# Altium footprint library 6-Connectors-3.PcbLib: 153 footprints (part 4 of 11)
Each footprint in its own frame and in the unit in brackets; x right, y up, seen from the top. Pads: shape width x height; smd on the part's side, far side on the other; paste and mask are expansions set on the pad; w line width, h text height; cw(c..) or ccw(c..) is an arc to the next point about the centre after c.
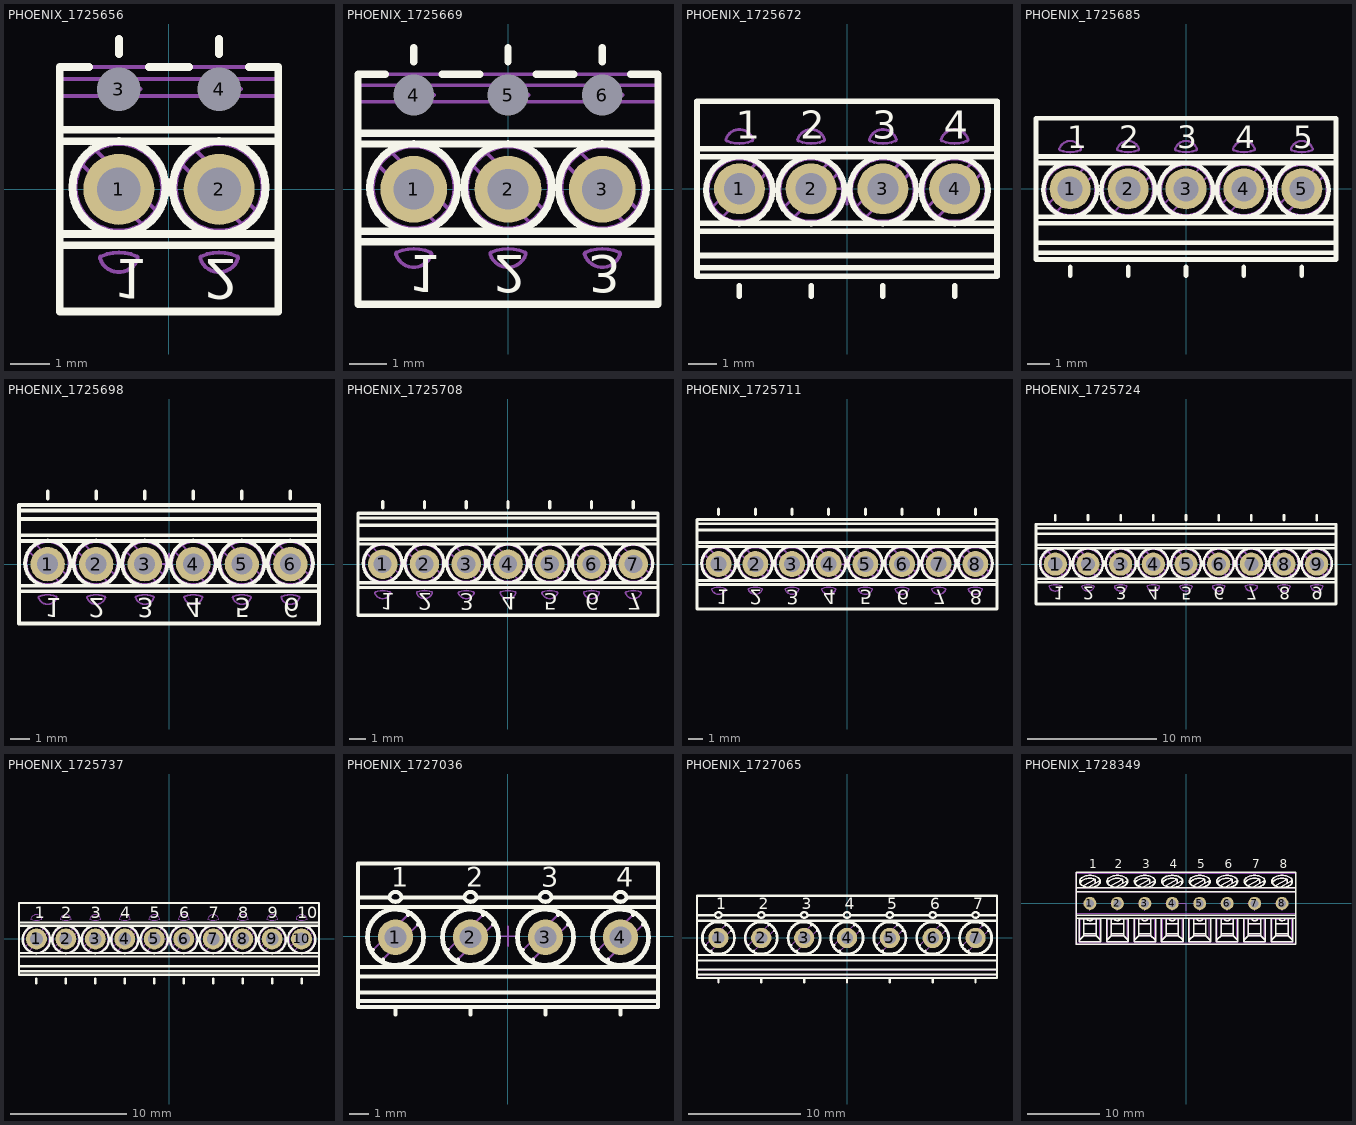
[diagram p3: the footprints below, top view; thin cyan lines are the x and y axes]

## PHOENIX_1725656 [mm] "Micro PCB Terminal Block, Pitch 2.54mm, 2 Positions, Screw Connection"
height 8.5
pads (4):
  round 1.8 hole 1.1: 1(-1.27,0) 2(1.27,0)
  round 1 hole 1.1 unplated: 3(-1.27,2.54) 4(1.27,2.54)
Top Overlay:
  circle w0.2: c-1.27,0.05 r1.18
  circle w0.2: c1.27,0.05 r1.18
  lines w0.2: -2.77,-1.417 2.77,-1.417 ; -2.77,-1.132 2.77,-1.132 ; -2.77,1.22 2.77,1.22 ; -2.77,1.51 2.77,1.51 ; -2.032,3.1 -2.77,3.1 -2.77,-3.1 2.77,-3.1 2.77,3.1 2.032,3.1 ; -1.27,3.429 -1.27,3.81 ; -0.508,3.1 0.508,3.1 ; 1.27,3.429 1.27,3.81
  text "2" at 0.889,-1.778 h1
  text "1" at -1.397,-1.778 h1
Mechanical 8:
  lines w0.1: -1.82,0 -1.27,0 -1.27,0.55 ; -1.27,3.09 -1.27,2.54 -0.72,2.54 ; 1.27,0.55 1.27,0 1.82,0 ; 1.27,3.09 1.27,2.54 1.82,2.54
Mechanical 14:
  circle w0.1: c-1.27,0.05 r1.1
  circle w0.1: c1.27,0.05 r1.1
  lines w0.1: -2.77,-1.417 2.77,-1.417 ; -2.77,-1.132 2.77,-1.132 ; -2.77,1.22 2.77,1.22 ; -2.77,1.51 2.77,1.51 ; -2.77,2.361 2.77,2.361 ; -2.77,2.8 2.77,2.8 ; -2.168,0.594 -0.726,-0.848 ; -1.814,0.948 -0.372,-0.494 ; 0.372,0.594 1.814,-0.848 ; 0.726,0.948 2.168,-0.494 ; -2.77,-3.1 -2.77,3.1 2.77,3.1 2.77,-3.1 -2.77,-3.1 ; -1.745,-1.757 ccw(c-1.27,-1.6) -0.795,-1.757 ccw(c-0.843,-1.741) -0.822,-1.696 ccw(c-1.27,-2.696) -1.718,-1.696 ccw(c-1.697,-1.741) -1.745,-1.757 ; 0.795,-1.757 cw(c0.843,-1.741) 0.822,-1.696 cw(c1.27,-2.696) 1.718,-1.696 cw(c1.697,-1.741) 1.745,-1.757 cw(c1.27,-1.6) 0.795,-1.757
3D body "PHOENIX_1725656.stp": height 8.5, standoff -3.5, extent -2.77,-3.1 2.77,3.1

## PHOENIX_1725669 [mm] "Micro PCB Terminal Block, Pitch 2.54mm, 3 Positions, Screw Connection"
height 8.5
pads (6):
  round 1.8 hole 1.1: 1(-2.54,0) 2(0,0) 3(2.54,0)
  round 1 hole 1.1 unplated: 4(-2.54,2.54) 5(0,2.54) 6(2.54,2.54)
Top Overlay:
  circle w0.2: c-2.54,0.05 r1.18
  circle w0.2: c0,0.05 r1.18
  circle w0.2: c2.54,0.05 r1.18
  lines w0.2: -4.04,-1.417 4.04,-1.417 ; -4.04,-1.132 4.04,-1.132 ; -4.04,1.22 4.04,1.22 ; -4.04,1.51 4.04,1.51 ; -3.302,3.1 -4.04,3.1 -4.04,-3.1 4.04,-3.1 4.04,3.1 3.302,3.1 ; -2.54,3.429 -2.54,3.81 ; -1.778,3.1 -0.762,3.1 ; 0,3.429 0,3.81 ; 0.762,3.1 1.778,3.1 ; 2.54,3.429 2.54,3.81
  text "1" at -2.667,-1.778 h1
  text "2" at -0.381,-1.778 h1
  text "3" at 2.159,-1.778 h1
Mechanical 8:
  lines w0.1: -3.09,0 -2.54,0 -2.54,0.55 ; -2.54,3.09 -2.54,2.54 -1.99,2.54 ; -0.55,0 0,0 0,0.55 ; 0,3.09 0,2.54 0.55,2.54 ; 1.99,0 2.54,0 2.54,0.55 ; 2.54,3.09 2.54,2.54 3.09,2.54
Mechanical 14:
  circle w0.1: c-2.54,0.05 r1.1
  circle w0.1: c0,0.05 r1.1
  circle w0.1: c2.54,0.05 r1.1
  lines w0.1: -4.04,-1.417 4.04,-1.417 ; -4.04,-1.132 4.04,-1.132 ; -4.04,1.22 4.04,1.22 ; -4.04,1.51 4.04,1.51 ; -4.04,2.361 4.04,2.361 ; -4.04,2.8 4.04,2.8 ; -3.474,0.631 -1.959,-0.884 ; -3.121,0.984 -1.606,-0.531 ; -0.934,0.631 0.581,-0.884 ; -0.581,0.984 0.934,-0.531 ; 1.606,0.631 3.121,-0.884 ; 1.959,0.984 3.474,-0.531 ; -4.04,-3.1 4.04,-3.1 4.04,3.1 -4.04,3.1 -4.04,-3.1 ; -3.015,-1.757 cw(c-2.967,-1.741) -2.988,-1.696 cw(c-2.54,-2.696) -2.092,-1.696 cw(c-2.113,-1.741) -2.065,-1.757 cw(c-2.54,-1.6) -3.015,-1.757 ; -0.475,-1.757 cw(c-0.427,-1.741) -0.448,-1.696 cw(c0,-2.696) 0.448,-1.696 cw(c0.427,-1.741) 0.475,-1.757 cw(c0,-1.6) -0.475,-1.757 ; 2.065,-1.757 cw(c2.113,-1.741) 2.092,-1.696 cw(c2.54,-2.696) 2.988,-1.696 cw(c2.967,-1.741) 3.015,-1.757 cw(c2.54,-1.6) 2.065,-1.757
3D body "PHOENIX_1725669.stp": height 8.5, standoff -3.5, extent -4.04,-3.1 4.04,3.1

## PHOENIX_1725672 [mm] "Micro PCB Terminal Block, Pitch 2.54mm, 4 Positions, Screw Connection"
height 8.5
pads (4):
  round 1.8 hole 1.1: 1(-3.81,0) 2(-1.27,0) 3(1.27,0) 4(3.81,0)
Top Overlay:
  circle w0.2: c-3.81,-0.05 r1.18
  circle w0.2: c-1.27,-0.05 r1.18
  circle w0.2: c1.27,-0.05 r1.18
  circle w0.2: c3.81,-0.05 r1.18
  lines w0.2: -5.31,-2.8 5.31,-2.8 ; -5.31,-2.361 5.31,-2.361 ; -5.31,-1.51 5.31,-1.51 ; -5.31,-1.22 5.31,-1.22 ; -5.31,1.132 5.31,1.132 ; -5.31,1.417 5.31,1.417 ; -3.81,-3.81 -3.81,-3.429 ; -1.27,-3.81 -1.27,-3.429 ; 1.27,-3.81 1.27,-3.429 ; 3.81,-3.81 3.81,-3.429 ; -5.31,-3.1 5.31,-3.1 5.31,3.1 -5.31,3.1 -5.31,-3.1
  text "4" at 3.429,1.778 h1
  text "1" at -3.937,1.778 h1
  text "2" at -1.651,1.778 h1
  text "3" at 0.889,1.778 h1
Mechanical 8:
  lines w0.1: -4.36,0 -3.81,0 -3.81,-0.55 ; -1.82,0 -1.27,0 -1.27,-0.55 ; -0.55,0 0,0 0,-0.55 ; 0.72,0 1.27,0 1.27,-0.55 ; 3.26,0 3.81,0 3.81,-0.55
Mechanical 14:
  circle w0.1: c-3.81,-0.05 r1.1
  circle w0.1: c-1.27,-0.05 r1.1
  circle w0.1: c1.27,-0.05 r1.1
  circle w0.1: c3.81,-0.05 r1.1
  lines w0.1: -5.31,-2.8 5.31,-2.8 ; -5.31,-2.361 5.31,-2.361 ; -5.31,-1.51 5.31,-1.51 ; -5.31,-1.22 5.31,-1.22 ; -5.31,1.132 5.31,1.132 ; -5.31,1.417 5.31,1.417 ; -4.744,-0.631 -3.229,0.884 ; -4.391,-0.984 -2.876,0.531 ; -2.204,-0.631 -0.689,0.884 ; -1.851,-0.984 -0.336,0.531 ; 0.336,-0.631 1.851,0.884 ; 0.689,-0.984 2.204,0.531 ; 2.876,-0.631 4.391,0.884 ; 3.229,-0.984 4.744,0.531 ; -5.31,-3.1 5.31,-3.1 5.31,3.1 -5.31,3.1 -5.31,-3.1 ; -4.285,1.757 ccw(c-4.237,1.741) -4.258,1.696 ccw(c-3.81,2.697) -3.362,1.696 ccw(c-3.383,1.741) -3.335,1.757 ccw(c-3.81,1.6) -4.285,1.757 ; -1.745,1.757 ccw(c-1.697,1.741) -1.718,1.696 ccw(c-1.27,2.697) -0.822,1.696 ccw(c-0.843,1.741) -0.795,1.757 ccw(c-1.27,1.6) -1.745,1.757 ; 0.795,1.757 ccw(c0.843,1.741) 0.822,1.696 ccw(c1.27,2.697) 1.718,1.696 ccw(c1.697,1.741) 1.745,1.757 ccw(c1.27,1.6) 0.795,1.757 ; 3.335,1.757 ccw(c3.383,1.741) 3.362,1.696 ccw(c3.81,2.697) 4.258,1.696 ccw(c4.237,1.741) 4.285,1.757 ccw(c3.81,1.6) 3.335,1.757
3D body "PHOENIX_1725672.stp": height 8.5, standoff -3.5, extent -5.31,-3.1 5.31,3.1

## PHOENIX_1725685 [mm] "Micro PCB Terminal Block, Pitch 2.54mm, 5 Positions, Screw Connection"
height 8.5
pads (5):
  round 1.8 hole 1.1: 1(-5.08,0) 2(-2.54,0) 3(0,0) 4(2.54,0) 5(5.08,0)
Top Overlay:
  circle w0.2: c-5.08,-0.05 r1.18
  circle w0.2: c-2.54,-0.05 r1.18
  circle w0.2: c0,-0.05 r1.18
  circle w0.2: c2.54,-0.05 r1.18
  circle w0.2: c5.08,-0.05 r1.18
  lines w0.2: -6.58,-2.8 6.58,-2.8 ; -6.58,-2.361 6.58,-2.361 ; -6.58,-1.51 6.58,-1.51 ; -6.58,-1.22 6.58,-1.22 ; -6.58,1.132 6.58,1.132 ; -6.58,1.417 6.58,1.417 ; -5.08,-3.81 -5.08,-3.429 ; -2.54,-3.81 -2.54,-3.429 ; 0,-3.81 0,-3.429 ; 2.54,-3.81 2.54,-3.429 ; 5.08,-3.81 5.08,-3.429 ; -6.58,-3.1 6.58,-3.1 6.58,3.1 -6.58,3.1 -6.58,-3.1
  text "5" at 4.699,1.778 h1
  text "3" at -0.381,1.778 h1
  text "2" at -2.921,1.778 h1
  text "1" at -5.207,1.778 h1
  text "4" at 2.159,1.778 h1
Mechanical 8:
  lines w0.1: -5.63,0 -5.08,0 -5.08,-0.55 ; -3.09,0 -2.54,0 -2.54,-0.55 ; -0.55,0 0,0 0,-0.55 ; 1.99,0 2.54,0 2.54,-0.55 ; 4.53,0 5.08,0 5.08,-0.55
Mechanical 14:
  circle w0.1: c2.54,-0.05 r1.1
  circle w0.1: c0,-0.05 r1.1
  circle w0.1: c-2.54,-0.05 r1.1
  circle w0.1: c-5.08,-0.05 r1.1
  circle w0.1: c5.08,-0.05 r1.1
  lines w0.1: -6.58,-2.8 6.58,-2.8 ; -6.58,-2.361 6.58,-2.361 ; -6.58,-1.51 6.58,-1.51 ; -6.58,-1.22 6.58,-1.22 ; -6.58,1.132 6.58,1.132 ; -6.58,1.417 6.58,1.417 ; -6.014,-0.631 -4.499,0.884 ; -5.661,-0.984 -4.146,0.531 ; -3.474,-0.631 -1.959,0.884 ; -3.121,-0.984 -1.606,0.531 ; -0.934,-0.631 0.581,0.884 ; -0.581,-0.984 0.934,0.531 ; 1.606,-0.631 3.121,0.884 ; 1.959,-0.984 3.474,0.531 ; 4.146,-0.631 5.661,0.884 ; 4.499,-0.984 6.014,0.531 ; -6.58,-3.1 6.58,-3.1 6.58,3.1 -6.58,3.1 -6.58,-3.1 ; -5.555,1.757 cw(c-5.08,1.6) -4.605,1.757 cw(c-4.653,1.741) -4.632,1.696 cw(c-5.08,2.696) -5.528,1.696 cw(c-5.507,1.741) -5.555,1.757 ; -3.015,1.757 cw(c-2.54,1.6) -2.065,1.757 cw(c-2.113,1.741) -2.092,1.696 cw(c-2.54,2.696) -2.988,1.696 cw(c-2.967,1.741) -3.015,1.757 ; -0.475,1.757 cw(c0,1.6) 0.475,1.757 cw(c0.427,1.741) 0.448,1.696 cw(c0,2.696) -0.448,1.696 cw(c-0.427,1.741) -0.475,1.757 ; 2.065,1.757 cw(c2.54,1.6) 3.015,1.757 cw(c2.967,1.741) 2.988,1.696 cw(c2.54,2.696) 2.092,1.696 cw(c2.113,1.741) 2.065,1.757 ; 4.605,1.757 cw(c5.08,1.6) 5.555,1.757 cw(c5.507,1.741) 5.528,1.696 cw(c5.08,2.696) 4.632,1.696 cw(c4.653,1.741) 4.605,1.757
3D body "PHOENIX_1725685.stp": height 8.5, standoff -3.5, extent -6.58,-3.1 6.58,3.1

## PHOENIX_1725698 [mm] "Micro PCB Terminal Block, Pitch 2.54mm, 6 Positions, Screw Connection"
height 8.5
pads (6):
  round 1.8 hole 1.1: 1(-6.35,0) 2(-3.81,0) 3(-1.27,0) 4(1.27,0) 5(3.81,0) 6(6.35,0)
Top Overlay:
  circle w0.2: c6.35,0.05 r1.18
  circle w0.2: c3.81,0.05 r1.18
  circle w0.2: c1.27,0.05 r1.18
  circle w0.2: c-1.27,0.05 r1.18
  circle w0.2: c-3.81,0.05 r1.18
  circle w0.2: c-6.35,0.05 r1.18
  lines w0.2: -7.85,-1.417 7.85,-1.417 ; -7.85,-1.132 7.85,-1.132 ; -7.85,1.22 7.85,1.22 ; -7.85,1.51 7.85,1.51 ; -7.85,2.361 7.85,2.361 ; -7.85,2.8 7.85,2.8 ; -6.35,3.429 -6.35,3.81 ; -3.81,3.429 -3.81,3.81 ; -1.27,3.429 -1.27,3.81 ; 1.27,3.429 1.27,3.81 ; 3.81,3.429 3.81,3.81 ; 6.35,3.429 6.35,3.81 ; -7.85,-3.1 -7.85,3.1 7.85,3.1 7.85,-3.1 -7.85,-3.1
  text "6" at 5.969,-1.778 h1
  text "4" at 0.889,-1.778 h1
  text "1" at -6.477,-1.778 h1
  text "2" at -4.191,-1.778 h1
  text "3" at -1.651,-1.778 h1
  text "5" at 3.429,-1.778 h1
Mechanical 8:
  lines w0.1: -0.55,0 0,0 0,0.55 ; -6.35,0 -6.9,0 -6.35,0 ; -6.35,0 -6.35,0.55 -6.35,0 ; -3.81,0 -4.36,0 -3.81,0 ; -3.81,0 -3.81,0.55 -3.81,0 ; -1.27,0 -1.82,0 -1.27,0 ; -1.27,0 -1.27,0.55 -1.27,0 ; 1.27,0 0.72,0 1.27,0 ; 1.27,0 1.27,0.55 1.27,0 ; 3.81,0 3.26,0 3.81,0 ; 3.81,0 3.81,0.55 3.81,0 ; 6.35,0 5.8,0 6.35,0 ; 6.35,0 6.35,0.55 6.35,0
Mechanical 14:
  circle w0.1: c3.81,0.05 r1.1
  circle w0.1: c-6.35,0.05 r1.1
  circle w0.1: c-3.81,0.05 r1.1
  circle w0.1: c-1.27,0.05 r1.1
  circle w0.1: c1.27,0.05 r1.1
  circle w0.1: c6.35,0.05 r1.1
  lines w0.1: -7.85,-1.417 7.85,-1.417 ; -7.85,-1.132 7.85,-1.132 ; -7.85,1.22 7.85,1.22 ; -7.85,1.51 7.85,1.51 ; -7.85,2.361 7.85,2.361 ; -7.85,2.8 7.85,2.8 ; -7.284,0.631 -5.769,-0.884 ; -6.931,0.984 -5.416,-0.531 ; -4.744,0.631 -3.229,-0.884 ; -4.391,0.984 -2.876,-0.531 ; -2.204,0.631 -0.689,-0.884 ; -1.851,0.984 -0.336,-0.531 ; 0.336,0.631 1.851,-0.884 ; 0.689,0.984 2.204,-0.531 ; 2.876,0.631 4.391,-0.884 ; 3.229,0.984 4.744,-0.531 ; 5.416,0.631 6.931,-0.884 ; 5.769,0.984 7.284,-0.531 ; -6.825,-1.757 ccw(c-6.35,-1.6) -5.875,-1.757 ; -6.825,-1.757 cw(c-6.777,-1.741) -6.798,-1.696 ; -6.825,-1.757 cw(c-6.777,-1.741) -6.798,-1.696 ; -6.825,-1.757 ccw(c-6.35,-1.6) -5.875,-1.757 ; -6.798,-1.696 cw(c-6.35,-2.696) -5.902,-1.696 ; -6.798,-1.696 cw(c-6.35,-2.696) -5.902,-1.696 ; -5.902,-1.696 cw(c-5.923,-1.741) -5.875,-1.757 ; -5.902,-1.696 cw(c-5.923,-1.741) -5.875,-1.757 ; -4.285,-1.757 ccw(c-3.81,-1.6) -3.335,-1.757 ; -4.285,-1.757 cw(c-4.237,-1.741) -4.258,-1.696 ; -4.285,-1.757 cw(c-4.237,-1.741) -4.258,-1.696 ; -4.285,-1.757 ccw(c-3.81,-1.6) -3.335,-1.757 ; -4.258,-1.696 cw(c-3.81,-2.696) -3.362,-1.696 ; -4.258,-1.696 cw(c-3.81,-2.696) -3.362,-1.696 ; -3.362,-1.696 cw(c-3.383,-1.741) -3.335,-1.757 ; -3.362,-1.696 cw(c-3.383,-1.741) -3.335,-1.757 ; -1.745,-1.757 ccw(c-1.27,-1.6) -0.795,-1.757 ; -1.745,-1.757 cw(c-1.697,-1.741) -1.718,-1.696 ; -1.745,-1.757 cw(c-1.697,-1.741) -1.718,-1.696 ; -1.745,-1.757 ccw(c-1.27,-1.6) -0.795,-1.757 ; -1.718,-1.696 cw(c-1.27,-2.696) -0.822,-1.696 ; -1.718,-1.696 cw(c-1.27,-2.696) -0.822,-1.696 ; -0.822,-1.696 cw(c-0.843,-1.741) -0.795,-1.757 ; -0.822,-1.696 cw(c-0.843,-1.741) -0.795,-1.757 ; 0.795,-1.757 ccw(c1.27,-1.6) 1.745,-1.757 ; 0.795,-1.757 cw(c0.843,-1.741) 0.822,-1.696 ; 0.795,-1.757 cw(c0.843,-1.741) 0.822,-1.696 ; 0.795,-1.757 ccw(c1.27,-1.6) 1.745,-1.757 ; 0.822,-1.696 cw(c1.27,-2.696) 1.718,-1.696 ; 0.822,-1.696 cw(c1.27,-2.696) 1.718,-1.696 ; 1.718,-1.696 cw(c1.697,-1.741) 1.745,-1.757 ; 1.718,-1.696 cw(c1.697,-1.741) 1.745,-1.757 ; 3.335,-1.757 ccw(c3.81,-1.6) 4.285,-1.757 ; 3.335,-1.757 cw(c3.383,-1.741) 3.362,-1.696 ; 3.335,-1.757 cw(c3.383,-1.741) 3.362,-1.696 ; 3.335,-1.757 ccw(c3.81,-1.6) 4.285,-1.757 ; 3.362,-1.696 cw(c3.81,-2.696) 4.258,-1.696 ; 3.362,-1.696 cw(c3.81,-2.696) 4.258,-1.696 ; 4.258,-1.696 cw(c4.237,-1.741) 4.285,-1.757 ; 4.258,-1.696 cw(c4.237,-1.741) 4.285,-1.757 ; 5.875,-1.757 ccw(c6.35,-1.6) 6.825,-1.757 ; 5.875,-1.757 cw(c5.923,-1.741) 5.902,-1.696 ; 5.875,-1.757 ccw(c6.35,-1.6) 6.825,-1.757 ; 5.875,-1.757 cw(c5.923,-1.741) 5.902,-1.696 ; 5.902,-1.696 cw(c6.35,-2.696) 6.798,-1.696 ; 5.902,-1.696 cw(c6.35,-2.696) 6.798,-1.696 ; 6.798,-1.696 cw(c6.777,-1.741) 6.825,-1.757 ; 6.798,-1.696 cw(c6.777,-1.741) 6.825,-1.757 ; -7.85,-3.1 -7.85,3.1 7.85,3.1 7.85,-3.1 -7.85,-3.1
3D body "PHOENIX_1725698.stp": height 8.5, standoff -3.5, extent -7.85,-3.1 7.85,3.1

## PHOENIX_1725708 [mm] "Micro PCB Terminal Block, Pitch 2.54mm, 7 Positions, Screw Connection"
height 8.5
pads (7):
  round 1.8 hole 1.1: 1(-7.62,0) 2(-5.08,0) 3(-2.54,0) 4(0,0) 5(2.54,0) 6(5.08,0) 7(7.62,0)
Top Overlay:
  circle w0.2: c7.62,0.05 r1.18
  circle w0.2: c5.08,0.05 r1.18
  circle w0.2: c2.54,0.05 r1.18
  circle w0.2: c0,0.05 r1.18
  circle w0.2: c-2.54,0.05 r1.18
  circle w0.2: c-5.08,0.05 r1.18
  circle w0.2: c-7.62,0.05 r1.18
  lines w0.2: -9.12,-1.417 9.12,-1.417 ; -9.12,-1.132 9.12,-1.132 ; -9.12,1.22 9.12,1.22 ; -9.12,1.51 9.12,1.51 ; -9.12,2.361 9.12,2.361 ; -9.12,2.8 9.12,2.8 ; -7.62,3.429 -7.62,3.81 ; -5.08,3.429 -5.08,3.81 ; -2.54,3.429 -2.54,3.81 ; 0,3.429 0,3.81 ; 2.54,3.429 2.54,3.81 ; 5.08,3.429 5.08,3.81 ; 7.62,3.429 7.62,3.81 ; -9.12,-3.1 9.12,-3.1 9.12,3.1 -9.12,3.1 -9.12,-3.1
  text "7" at 7.239,-1.778 h1
  text "5" at 2.159,-1.778 h1
  text "3" at -2.921,-1.778 h1
  text "2" at -5.461,-1.778 h1
  text "1" at -7.747,-1.778 h1
  text "4" at -0.381,-1.778 h1
  text "6" at 4.699,-1.778 h1
Mechanical 8:
  lines w0.1: -8.17,0 -7.62,0 ; -8.17,0 -7.62,0 ; -8.17,0 -7.62,0 ; -7.62,0 -7.62,0.55 ; -7.62,0 -7.62,0.55 ; -7.62,0 -7.62,0.55 ; -5.63,0 -5.08,0 ; -5.63,0 -5.08,0 ; -5.63,0 -5.08,0 ; -5.08,0 -5.08,0.55 ; -5.08,0 -5.08,0.55 ; -5.08,0 -5.08,0.55 ; -3.09,0 -2.54,0 ; -3.09,0 -2.54,0 ; -3.09,0 -2.54,0 ; -2.54,0 -2.54,0.55 ; -2.54,0 -2.54,0.55 ; -2.54,0 -2.54,0.55 ; -0.55,0 0,0 ; -0.55,0 0,0 ; -0.55,0 0,0 ; 0,0 0,0.55 ; 0,0 0,0.55 ; 0,0 0,0.55 ; 1.99,0 2.54,0 ; 1.99,0 2.54,0 ; 1.99,0 2.54,0 ; 2.54,0 2.54,0.55 ; 2.54,0 2.54,0.55 ; 2.54,0 2.54,0.55 ; 4.53,0 5.08,0 ; 4.53,0 5.08,0 ; 4.53,0 5.08,0 ; 5.08,0 5.08,0.55 ; 5.08,0 5.08,0.55 ; 5.08,0 5.08,0.55 ; 7.07,0 7.62,0 ; 7.07,0 7.62,0 ; 7.07,0 7.62,0 ; 7.62,0 7.62,0.55 ; 7.62,0 7.62,0.55 ; 7.62,0 7.62,0.55
Mechanical 14:
  circle w0.1: c5.08,0.05 r1.1
  circle w0.1: c0,0.05 r1.1
  circle w0.1: c-2.54,0.05 r1.1
  circle w0.1: c-5.08,0.05 r1.1
  circle w0.1: c-7.62,0.05 r1.1
  circle w0.1: c2.54,0.05 r1.1
  circle w0.1: c7.62,0.05 r1.1
  lines w0.1: -9.12,-1.417 9.12,-1.417 ; -9.12,-1.132 9.12,-1.132 ; -9.12,1.22 9.12,1.22 ; -9.12,1.51 9.12,1.51 ; -9.12,2.361 9.12,2.361 ; -9.12,2.8 9.12,2.8 ; -8.554,0.631 -7.039,-0.884 ; -8.201,0.984 -6.686,-0.531 ; -6.014,0.631 -4.499,-0.884 ; -5.661,0.984 -4.146,-0.531 ; -3.474,0.631 -1.959,-0.884 ; -3.121,0.984 -1.606,-0.531 ; -0.934,0.631 0.581,-0.884 ; -0.581,0.984 0.934,-0.531 ; 1.606,0.631 3.121,-0.884 ; 1.959,0.984 3.474,-0.531 ; 4.146,0.631 5.661,-0.884 ; 4.499,0.984 6.014,-0.531 ; 6.686,0.631 8.201,-0.884 ; 7.039,0.984 8.554,-0.531 ; -8.095,-1.757 ccw(c-7.62,-1.6) -7.145,-1.757 ; -8.095,-1.757 cw(c-8.047,-1.741) -8.068,-1.696 ; -8.095,-1.757 cw(c-8.047,-1.741) -8.068,-1.696 ; -8.095,-1.757 ccw(c-7.62,-1.6) -7.145,-1.757 ; -8.068,-1.696 cw(c-7.62,-2.696) -7.172,-1.696 ; -8.068,-1.696 cw(c-7.62,-2.696) -7.172,-1.696 ; -7.172,-1.696 cw(c-7.193,-1.741) -7.145,-1.757 ; -7.172,-1.696 cw(c-7.193,-1.741) -7.145,-1.757 ; -5.555,-1.757 ccw(c-5.08,-1.6) -4.605,-1.757 ; -5.555,-1.757 cw(c-5.507,-1.741) -5.528,-1.696 ; -5.555,-1.757 cw(c-5.507,-1.741) -5.528,-1.696 ; -5.555,-1.757 ccw(c-5.08,-1.6) -4.605,-1.757 ; -5.528,-1.696 cw(c-5.08,-2.696) -4.632,-1.696 ; -5.528,-1.696 cw(c-5.08,-2.696) -4.632,-1.696 ; -4.632,-1.696 cw(c-4.653,-1.741) -4.605,-1.757 ; -4.632,-1.696 cw(c-4.653,-1.741) -4.605,-1.757 ; -3.015,-1.757 ccw(c-2.54,-1.6) -2.065,-1.757 ; -3.015,-1.757 cw(c-2.967,-1.741) -2.988,-1.696 ; -3.015,-1.757 cw(c-2.967,-1.741) -2.988,-1.696 ; -3.015,-1.757 ccw(c-2.54,-1.6) -2.065,-1.757 ; -2.988,-1.696 cw(c-2.54,-2.696) -2.092,-1.696 ; -2.988,-1.696 cw(c-2.54,-2.696) -2.092,-1.696 ; -2.092,-1.696 cw(c-2.113,-1.741) -2.065,-1.757 ; -2.092,-1.696 cw(c-2.113,-1.741) -2.065,-1.757 ; -0.475,-1.757 ccw(c0,-1.6) 0.475,-1.757 ; -0.475,-1.757 cw(c-0.427,-1.741) -0.448,-1.696 ; -0.475,-1.757 cw(c-0.427,-1.741) -0.448,-1.696 ; -0.475,-1.757 ccw(c0,-1.6) 0.475,-1.757 ; -0.448,-1.696 cw(c0,-2.696) 0.448,-1.696 ; -0.448,-1.696 cw(c0,-2.696) 0.448,-1.696 ; 0.448,-1.696 cw(c0.427,-1.741) 0.475,-1.757 ; 0.448,-1.696 cw(c0.427,-1.741) 0.475,-1.757 ; 2.065,-1.757 ccw(c2.54,-1.6) 3.015,-1.757 ; 2.065,-1.757 cw(c2.113,-1.741) 2.092,-1.696 ; 2.065,-1.757 cw(c2.113,-1.741) 2.092,-1.696 ; 2.065,-1.757 ccw(c2.54,-1.6) 3.015,-1.757 ; 2.092,-1.696 cw(c2.54,-2.696) 2.988,-1.696 ; 2.092,-1.696 cw(c2.54,-2.696) 2.988,-1.696 ; 2.988,-1.696 cw(c2.967,-1.741) 3.015,-1.757 ; 2.988,-1.696 cw(c2.967,-1.741) 3.015,-1.757 ; 4.605,-1.757 cw(c4.653,-1.741) 4.632,-1.696 ; 4.605,-1.757 ccw(c5.08,-1.6) 5.555,-1.757 ; 4.605,-1.757 cw(c4.653,-1.741) 4.632,-1.696 ; 4.605,-1.757 ccw(c5.08,-1.6) 5.555,-1.757 ; 4.632,-1.696 cw(c5.08,-2.696) 5.528,-1.696 ; 4.632,-1.696 cw(c5.08,-2.696) 5.528,-1.696 ; 5.528,-1.696 cw(c5.507,-1.741) 5.555,-1.757 ; 5.528,-1.696 cw(c5.507,-1.741) 5.555,-1.757 ; 7.145,-1.757 ccw(c7.62,-1.6) 8.095,-1.757 ; 7.145,-1.757 cw(c7.193,-1.741) 7.172,-1.696 ; 7.145,-1.757 ccw(c7.62,-1.6) 8.095,-1.757 ; 7.145,-1.757 cw(c7.193,-1.741) 7.172,-1.696 ; 7.172,-1.696 cw(c7.62,-2.696) 8.068,-1.696 ; 7.172,-1.696 cw(c7.62,-2.696) 8.068,-1.696 ; 8.068,-1.696 cw(c8.047,-1.741) 8.095,-1.757 ; 8.068,-1.696 cw(c8.047,-1.741) 8.095,-1.757 ; -9.12,-3.1 9.12,-3.1 9.12,3.1 -9.12,3.1 -9.12,-3.1
3D body "PHOENIX_1725708.stp": height 8.5, standoff -3.5, extent -9.12,-3.1 9.12,3.1

## PHOENIX_1725711 [mm] "Micro PCB Terminal Block, Pitch 2.54mm, 8 Positions, Screw Connection"
height 8.5
pads (8):
  round 1.8 hole 1.1: 1(-8.89,0) 2(-6.35,0) 3(-3.81,0) 4(-1.27,0) 5(1.27,0) 6(3.81,0) 7(6.35,0) 8(8.89,0)
Top Overlay:
  circle w0.2: c-8.89,0.05 r1.18
  circle w0.2: c-6.35,0.05 r1.18
  circle w0.2: c-3.81,0.05 r1.18
  circle w0.2: c-1.27,0.05 r1.18
  circle w0.2: c1.27,0.05 r1.18
  circle w0.2: c3.81,0.05 r1.18
  circle w0.2: c6.35,0.05 r1.18
  circle w0.2: c8.89,0.05 r1.18
  lines w0.2: -10.39,-1.417 10.39,-1.417 ; -10.39,-1.132 10.39,-1.132 ; -10.39,1.22 10.39,1.22 ; -10.39,1.51 10.39,1.51 ; -10.39,2.361 10.39,2.361 ; -10.39,2.8 10.39,2.8 ; -8.89,3.429 -8.89,3.81 ; -6.35,3.429 -6.35,3.81 ; -3.81,3.429 -3.81,3.81 ; -1.27,3.429 -1.27,3.81 ; 1.27,3.429 1.27,3.81 ; 3.81,3.429 3.81,3.81 ; 6.35,3.429 6.35,3.81 ; 8.89,3.429 8.89,3.81 ; -10.39,-3.1 -10.39,3.1 10.39,3.1 10.39,-3.1 -10.39,-3.1
  text "6" at 3.429,-1.778 h1
  text "4" at -1.651,-1.778 h1
  text "1" at -9.017,-1.778 h1
  text "2" at -6.731,-1.778 h1
  text "3" at -4.191,-1.778 h1
  text "5" at 0.889,-1.778 h1
  text "7" at 5.969,-1.778 h1
  text "8" at 8.509,-1.778 h1
Mechanical 8:
  lines w0.1: -0.55,0 0,0 0,0.55 ; -9.44,0 -8.89,0 ; -9.44,0 -8.89,0 ; -9.44,0 -8.89,0 ; -9.44,0 -8.89,0 ; -8.89,0 -8.89,0.55 ; -8.89,0 -8.89,0.55 ; -8.89,0 -8.89,0.55 ; -8.89,0 -8.89,0.55 ; -6.9,0 -6.35,0 ; -6.9,0 -6.35,0 ; -6.9,0 -6.35,0 ; -6.9,0 -6.35,0 ; -6.35,0 -6.35,0.55 ; -6.35,0 -6.35,0.55 ; -6.35,0 -6.35,0.55 ; -6.35,0 -6.35,0.55 ; -4.36,0 -3.81,0 ; -4.36,0 -3.81,0 ; -4.36,0 -3.81,0 ; -4.36,0 -3.81,0 ; -3.81,0 -3.81,0.55 ; -3.81,0 -3.81,0.55 ; -3.81,0 -3.81,0.55 ; -3.81,0 -3.81,0.55 ; -1.82,0 -1.27,0 ; -1.82,0 -1.27,0 ; -1.82,0 -1.27,0 ; -1.82,0 -1.27,0 ; -1.27,0 -1.27,0.55 ; -1.27,0 -1.27,0.55 ; -1.27,0 -1.27,0.55 ; -1.27,0 -1.27,0.55 ; 0.72,0 1.27,0 ; 0.72,0 1.27,0 ; 0.72,0 1.27,0 ; 0.72,0 1.27,0 ; 1.27,0 1.27,0.55 ; 1.27,0 1.27,0.55 ; 1.27,0 1.27,0.55 ; 1.27,0 1.27,0.55 ; 3.26,0 3.81,0 ; 3.26,0 3.81,0 ; 3.26,0 3.81,0 ; 3.26,0 3.81,0 ; 3.81,0 3.81,0.55 ; 3.81,0 3.81,0.55 ; 3.81,0 3.81,0.55 ; 3.81,0 3.81,0.55 ; 5.8,0 6.35,0 ; 5.8,0 6.35,0 ; 5.8,0 6.35,0 ; 5.8,0 6.35,0 ; 6.35,0 6.35,0.55 ; 6.35,0 6.35,0.55 ; 6.35,0 6.35,0.55 ; 6.35,0 6.35,0.55 ; 8.34,0 8.89,0 ; 8.34,0 8.89,0 ; 8.34,0 8.89,0 ; 8.34,0 8.89,0 ; 8.89,0 8.89,0.55 ; 8.89,0 8.89,0.55 ; 8.89,0 8.89,0.55 ; 8.89,0 8.89,0.55
Mechanical 14:
  circle w0.1: c3.81,0.05 r1.1
  circle w0.1: c-1.27,0.05 r1.1
  circle w0.1: c-3.81,0.05 r1.1
  circle w0.1: c-6.35,0.05 r1.1
  circle w0.1: c-8.89,0.05 r1.1
  circle w0.1: c1.27,0.05 r1.1
  circle w0.1: c6.35,0.05 r1.1
  circle w0.1: c8.89,0.05 r1.1
  lines w0.1: -10.39,-1.417 10.39,-1.417 ; -10.39,-1.132 10.39,-1.132 ; -10.39,1.22 10.39,1.22 ; -10.39,1.51 10.39,1.51 ; -10.39,2.361 10.39,2.361 ; -10.39,2.8 10.39,2.8 ; -9.824,0.631 -8.309,-0.884 ; -9.471,0.984 -7.956,-0.531 ; -7.284,0.631 -5.769,-0.884 ; -6.931,0.984 -5.416,-0.531 ; -4.744,0.631 -3.229,-0.884 ; -4.391,0.984 -2.876,-0.531 ; -2.204,0.631 -0.689,-0.884 ; -1.851,0.984 -0.336,-0.531 ; 0.336,0.631 1.851,-0.884 ; 0.689,0.984 2.204,-0.531 ; 2.876,0.631 4.391,-0.884 ; 3.229,0.984 4.744,-0.531 ; 5.416,0.631 6.931,-0.884 ; 5.769,0.984 7.284,-0.531 ; 7.956,0.631 9.471,-0.884 ; 8.309,0.984 9.824,-0.531 ; -10.39,-3.1 10.39,-3.1 10.39,3.1 -10.39,3.1 -10.39,-3.1 ; -9.365,-1.757 cw(c-9.317,-1.741) -9.338,-1.696 cw(c-8.89,-2.696) -8.442,-1.696 cw(c-8.463,-1.741) -8.415,-1.757 cw(c-8.89,-1.6) -9.365,-1.757 ; -6.825,-1.757 cw(c-6.777,-1.741) -6.798,-1.696 cw(c-6.35,-2.696) -5.902,-1.696 cw(c-5.923,-1.741) -5.875,-1.757 cw(c-6.35,-1.6) -6.825,-1.757 ; -4.285,-1.757 cw(c-4.237,-1.741) -4.258,-1.696 cw(c-3.81,-2.696) -3.362,-1.696 cw(c-3.383,-1.741) -3.335,-1.757 cw(c-3.81,-1.6) -4.285,-1.757 ; -1.745,-1.757 cw(c-1.697,-1.741) -1.718,-1.696 cw(c-1.27,-2.696) -0.822,-1.696 cw(c-0.843,-1.741) -0.795,-1.757 cw(c-1.27,-1.6) -1.745,-1.757 ; 0.795,-1.757 cw(c0.843,-1.741) 0.822,-1.696 cw(c1.27,-2.696) 1.718,-1.696 cw(c1.697,-1.741) 1.745,-1.757 cw(c1.27,-1.6) 0.795,-1.757 ; 3.335,-1.757 cw(c3.383,-1.741) 3.362,-1.696 cw(c3.81,-2.696) 4.258,-1.696 cw(c4.237,-1.741) 4.285,-1.757 cw(c3.81,-1.6) 3.335,-1.757 ; 5.875,-1.757 cw(c5.923,-1.741) 5.902,-1.696 cw(c6.35,-2.696) 6.798,-1.696 cw(c6.777,-1.741) 6.825,-1.757 cw(c6.35,-1.6) 5.875,-1.757 ; 8.415,-1.757 cw(c8.463,-1.741) 8.442,-1.696 cw(c8.89,-2.696) 9.338,-1.696 cw(c9.317,-1.741) 9.365,-1.757 cw(c8.89,-1.6) 8.415,-1.757